# Altium footprint library Lay-51943_B.brd.PcbLib: 38 footprints (part 1 of 3)
Each footprint in its own frame and in the unit in brackets; x right, y up, seen from the top. Pads: shape width x height; smd on the part's side, far side on the other; paste and mask are expansions set on the pad; w line width, h text height; cw(c..) or ccw(c..) is an arc to the next point about the centre after c.
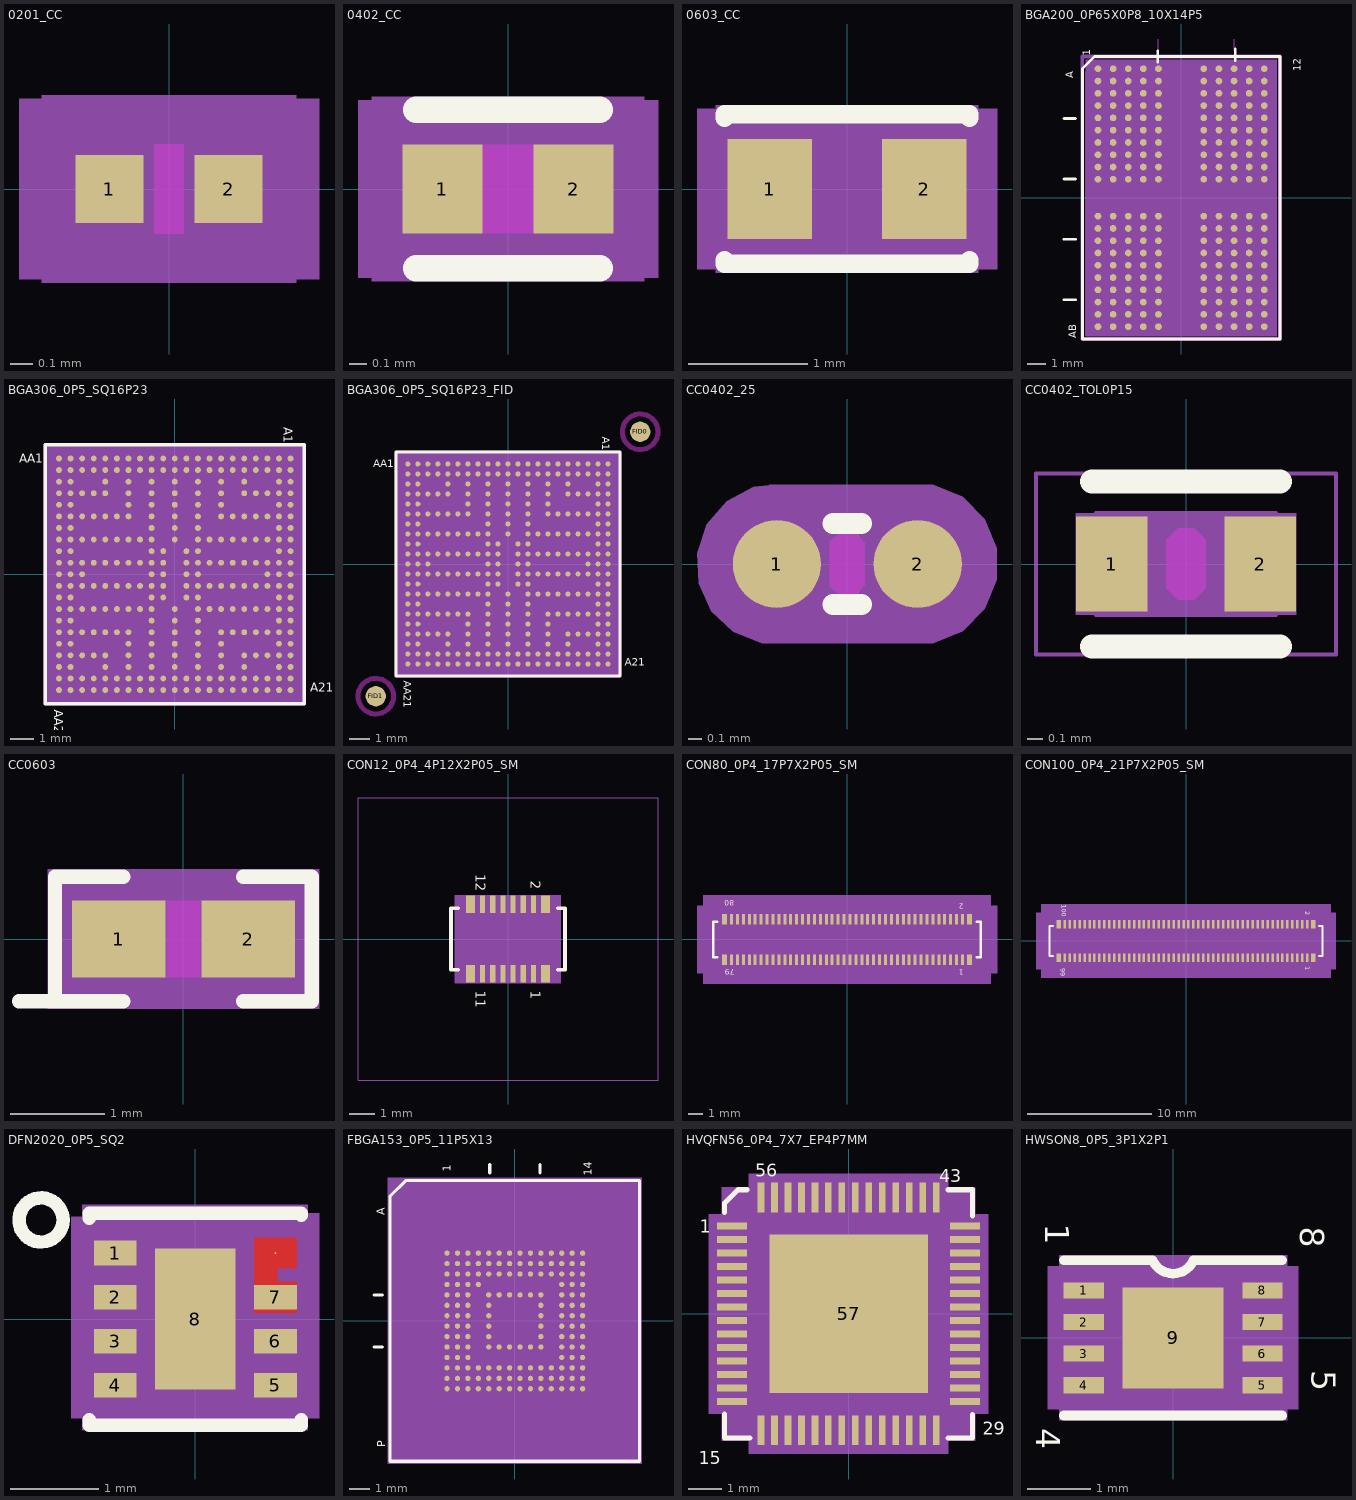
[diagram p0: the footprints below, top view; thin cyan lines are the x and y axes]

## 0201_CC [mil] "0201_CC"
pads (2):
  rect 12x12 smd: 1(-10.51,0) 2(10.51,0)
Top Layer keep-out:
  region: -2.64,7.87 -2.64,-7.87 2.64,-7.87 2.64,7.87
  region: -2.64,7.87 -2.64,-7.87 2.64,-7.87 2.64,7.87
Top Courtyard:
  region: -22.4,-16.5 -22.4,-15.91 -26.42,-15.91 -26.42,15.91 -22.4,15.91 -22.4,16.5 22.4,16.5 22.4,15.91 26.42,15.91 26.42,-15.91 22.4,-15.91 22.4,-16.5
Top Assembly:
  lines w1: -12.4,-6.5 -12.4,6.5 12.4,6.5 12.4,-6.5 -12.4,-6.5
Top Value:
  text ".Comment" at -51.17,-7.5 h15
Top Component Center:
  lines w1: -10,0 10,0 ; 0,-10 0,10
Top Designator:
  text ".Designator" at -54.7,-5.36 h15
Top Component Outline:
  region: -16.42,-5.91 -12.4,-5.91 -12.4,-6.5 12.4,-6.5 12.4,-5.91 16.42,-5.91 16.42,5.91 12.4,5.91 12.4,6.5 -12.4,6.5 -12.4,5.91 -16.42,5.91
3D body "CAPC0603X33N EIA 2220.step": height 12.99, standoff 0, extent -11.81,-5.91 11.81,5.91

## 0402_CC [mil] "0402_CC"
pads (2):
  rect 18x20 smd: 1(-14.76,0) 2(14.76,0)
Top Layer keep-out:
  region: -5.75,10 -5.75,-10 5.75,-10 5.75,10
  region: -5.75,10 -5.75,-10 5.75,-10 5.75,10
Top Overlay:
  lines w6: -20.67,-17.83 20.67,-17.83 ; -20.67,17.83 20.67,17.83
Top Courtyard:
  region: -30.67,-20.83 -30.67,-20 -33.78,-20 -33.78,20 -30.67,20 -30.67,20.83 30.67,20.83 30.67,20 33.78,20 33.78,-20 30.67,-20 30.67,-20.83
Top Assembly:
  lines w1: -20.67,-10.83 20.67,-10.83 20.67,10.83 -20.67,10.83 -20.67,-10.83
Top Value:
  text ".Comment" at -51.17,-7.5 h15
Top Component Center:
  lines w1: -10,0 10,0 ; 0,-10 0,10
Top Designator:
  text ".Designator" at -54.7,-5.36 h15
Top Component Outline:
  region: -23.78,-10 -20.67,-10 -20.67,-10.83 20.67,-10.83 20.67,-10 23.78,-10 23.78,10 20.67,10 20.67,10.83 -20.67,10.83 -20.67,10 -23.78,10
3D body "CAPC1005X60N EIA 0402.step": height 23.62, standoff 0, extent -19.68,-9.84 19.68,9.84

## 0603_CC [mil] "0603_CC"
pads (2):
  rect 28x33 smd: 1(-25.59,0) 2(25.59,0)
Top Overlay:
  lines w6: -40.47,-23.54 -40.47,-24.72 40.47,-24.72 40.47,-23.54 ; -40.47,23.54 -40.47,24.72 40.47,24.72 40.47,23.54
Top Courtyard:
  region: -43.46,-26.54 -49.61,-26.54 -49.61,26.54 -43.46,26.54 -43.46,27.72 43.46,27.72 43.46,26.54 49.61,26.54 49.61,-26.54 43.46,-26.54 43.46,-27.72 -43.46,-27.72
Top Assembly:
  lines w1: -33.46,-17.72 33.46,-17.72 33.46,17.72 -33.46,17.72 -33.46,-17.72
Top Value:
  text ".Comment" at -51.17,-7.5 h15
Top Component Center:
  lines w1: -10,0 10,0 ; 0,-10 0,10
Top Designator:
  text ".Designator" at -54.7,-5.36 h15
Top Component Outline:
  region: -39.61,-16.54 -33.46,-16.54 -33.46,-17.72 33.46,-17.72 33.46,-16.54 39.61,-16.54 39.61,16.54 33.46,16.54 33.46,17.72 -33.46,17.72 -33.46,16.54 -39.61,16.54
  region: -33.46,-17.72 33.46,-17.72 33.46,-16.54 39.61,-16.54 39.61,16.54 33.46,16.54 33.46,17.72 -33.46,17.72 -33.46,16.54 -39.61,16.54 -39.61,-16.54 -33.46,-16.54
3D body "CAPC1608X92N EIA 0603.step": height 36.22, standoff 0, extent -31.5,-15.75 31.5,15.75

## BGA200_0P65X0P8_10X14P5 [mil] "BGA200_0P65X0P8_10X14P5"
pads (200):
  round 14 smd: A1(-173.23,268.7) A2(-141.73,268.7) A3(-110.24,268.7) A4(-78.74,268.7) A5(-47.24,268.7) A8(47.24,268.7) A9(78.74,268.7) A10(110.24,268.7) A11(141.73,268.7) A12(173.23,268.7) AA1(-173.23,-243.11) AA2(-141.73,-243.11) AA3(-110.24,-243.11) AA4(-78.74,-243.11) AA5(-47.24,-243.11) AA8(47.24,-243.11) AA9(78.74,-243.11) AA10(110.24,-243.11) AA11(141.73,-243.11) AA12(173.23,-243.11) AB1(-173.23,-268.7) AB2(-141.73,-268.7) AB3(-110.24,-268.7) AB4(-78.74,-268.7) AB5(-47.24,-268.7) AB8(47.24,-268.7) AB9(78.74,-268.7) AB10(110.24,-268.7) AB11(141.73,-268.7) AB12(173.23,-268.7) B1(-173.23,243.11) B2(-141.73,243.11) B3(-110.24,243.11) B4(-78.74,243.11) B5(-47.24,243.11) B8(47.24,243.11) B9(78.74,243.11) B10(110.24,243.11) B11(141.73,243.11) B12(173.23,243.11) C1(-173.23,217.52) C2(-141.73,217.52) C3(-110.24,217.52) C4(-78.74,217.52) C5(-47.24,217.52) C8(47.24,217.52) C9(78.74,217.52) C10(110.24,217.52) C11(141.73,217.52) C12(173.23,217.52) D1(-173.23,191.93) D2(-141.73,191.93) D3(-110.24,191.93) D4(-78.74,191.93) D5(-47.24,191.93) D8(47.24,191.93) D9(78.74,191.93) D10(110.24,191.93) D11(141.73,191.93) D12(173.23,191.93) E1(-173.23,166.34) E2(-141.73,166.34) E3(-110.24,166.34) E4(-78.74,166.34) E5(-47.24,166.34) E8(47.24,166.34) E9(78.74,166.34) E10(110.24,166.34) E11(141.73,166.34) E12(173.23,166.34) F1(-173.23,140.75) F2(-141.73,140.75) F3(-110.24,140.75) F4(-78.74,140.75) F5(-47.24,140.75) F8(47.24,140.75) F9(78.74,140.75) F10(110.24,140.75) F11(141.73,140.75) F12(173.23,140.75) G1(-173.23,115.16) G2(-141.73,115.16) G3(-110.24,115.16) G4(-78.74,115.16) G5(-47.24,115.16) G8(47.24,115.16) G9(78.74,115.16) G10(110.24,115.16) G11(141.73,115.16) G12(173.23,115.16) H1(-173.23,89.57) H2(-141.73,89.57) H3(-110.24,89.57) H4(-78.74,89.57) H5(-47.24,89.57) H8(47.24,89.57) H9(78.74,89.57) H10(110.24,89.57) H11(141.73,89.57) H12(173.23,89.57) J1(-173.23,63.98) J2(-141.73,63.98) J3(-110.24,63.98) J4(-78.74,63.98) J5(-47.24,63.98) J8(47.24,63.98) J9(78.74,63.98) J10(110.24,63.98) J11(141.73,63.98) J12(173.23,63.98) K1(-173.23,38.39) K2(-141.73,38.39) K3(-110.24,38.39) K4(-78.74,38.39) K5(-47.24,38.39) K8(47.24,38.39) K9(78.74,38.39) K10(110.24,38.39) K11(141.73,38.39) K12(173.23,38.39) N1(-173.23,-38.39) N2(-141.73,-38.39) N3(-110.24,-38.39) N4(-78.74,-38.39) N5(-47.24,-38.39) N8(47.24,-38.39) N9(78.74,-38.39) N10(110.24,-38.39) N11(141.73,-38.39) N12(173.23,-38.39) P1(-173.23,-63.98) P2(-141.73,-63.98) P3(-110.24,-63.98) P4(-78.74,-63.98) P5(-47.24,-63.98) P8(47.24,-63.98) P9(78.74,-63.98) P10(110.24,-63.98) P11(141.73,-63.98) P12(173.23,-63.98) R1(-173.23,-89.57) R2(-141.73,-89.57) R3(-110.24,-89.57) R4(-78.74,-89.57) R5(-47.24,-89.57) R8(47.24,-89.57) R9(78.74,-89.57) R10(110.24,-89.57) R11(141.73,-89.57) R12(173.23,-89.57) T1(-173.23,-115.16) T2(-141.73,-115.16) T3(-110.24,-115.16) T4(-78.74,-115.16) T5(-47.24,-115.16) T8(47.24,-115.16) T9(78.74,-115.16) T10(110.24,-115.16) T11(141.73,-115.16) T12(173.23,-115.16) U1(-173.23,-140.75) U2(-141.73,-140.75) U3(-110.24,-140.75) U4(-78.74,-140.75) U5(-47.24,-140.75) U8(47.24,-140.75) U9(78.74,-140.75) U10(110.24,-140.75) U11(141.73,-140.75) U12(173.23,-140.75) V1(-173.23,-166.34) V2(-141.73,-166.34) V3(-110.24,-166.34) V4(-78.74,-166.34) V5(-47.24,-166.34) V8(47.24,-166.34) V9(78.74,-166.34) V10(110.24,-166.34) V11(141.73,-166.34) V12(173.23,-166.34) W1(-173.23,-191.93) W2(-141.73,-191.93) W3(-110.24,-191.93) W4(-78.74,-191.93) W5(-47.24,-191.93) W8(47.24,-191.93) W9(78.74,-191.93) W10(110.24,-191.93) W11(141.73,-191.93) W12(173.23,-191.93) Y1(-173.23,-217.52) Y2(-141.73,-217.52) Y3(-110.24,-217.52) Y4(-78.74,-217.52) Y5(-47.24,-217.52) Y8(47.24,-217.52) Y9(78.74,-217.52) Y10(110.24,-217.52) Y11(141.73,-217.52) Y12(173.23,-217.52)
Top Overlay:
  lines w6: -244.09,-212.6 -220.47,-212.6 ; -244.09,-86.61 -220.47,-86.61 ; -244.09,39.37 -220.47,39.37 ; -244.09,165.35 -220.47,165.35 ; -48.69,282.48 -48.69,306.1 ; 112.65,285.86 112.65,309.48 ; -205.82,-294.4 205.82,-294.4 205.82,294.4 -180.82,294.4 -205.82,269.4 -205.82,-294.4
  text "AB" at -218.98,-292.93 h15
  text "A" at -224.32,248.74 h15
  text "1" at -189.51,295.77 h15
  text "12" at 249.39,263.64 h15
Top Courtyard:
  lines w7.87: -205.82,-294.4 -205.82,294.4 205.82,294.4 205.82,-294.4 -205.82,-294.4
Top Assembly:
  circle w2: c-173.23,259.84 r15.75
  lines w1: -244.09,-212.6 -220.47,-212.6 ; -244.09,-86.61 -220.47,-86.61 ; -244.09,39.37 -220.47,39.37 ; -244.09,165.35 -220.47,165.35 ; -47.24,307.09 -47.24,330.71 ; 110.24,307.09 110.24,330.71 ; -198.82,-287.4 198.82,-287.4 198.82,287.4 -173.82,287.4 -198.82,262.4 -198.82,-287.4
  text "AB" at -259.84,-283.46 h25
  text "A" at -236.22,259.84 h10
  text "12" at 173.23,307.09 h25
  text "1" at -173.23,307.09 h10
Top Value:
  text ".Comment" at 7.5,-51.17 h15
Top Component Center:
  lines w1: -10,0 10,0 ; 0,-10 0,10
Top Designator:
  text ".Designator" at 5.36,-54.7 h15
Top Component Outline:
  region: -198.82,-287.4 198.82,-287.4 198.82,287.4 -198.82,287.4
  region: -198.82,-287.4 198.82,-287.4 198.82,287.4 -198.82,287.4
3D body "FPGA200_LPDDR4.stp": height 39.37, standoff -2.52, extent -196.85,-295.28 196.85,295.28

## BGA306_0P5_SQ16P23 [mil] "SKT_BGA306_0P5_SQ16P23_ELAST but without the socket or elastomer crap. Without Fiducials"
pads (306):
  round 10 smd: A1(196.69,196.85) A2(196.69,177.17) A3(196.69,157.48) A4(196.69,137.8) A5(196.69,118.11) A6(196.69,98.43) A7(196.69,78.74) A8(196.69,59.06) A9(196.69,39.37) A10(196.69,19.69) A11(196.69,0) A12(196.69,-19.69) A13(196.69,-39.37) A14(196.69,-59.06) A15(196.69,-78.74) A16(196.69,-98.43) A17(196.69,-118.11) A18(196.69,-137.8) A19(196.69,-157.48) A20(196.69,-177.17) A21(196.69,-196.85) AA1(-197.01,196.85) AA2(-197.01,177.17) AA3(-197.01,157.48) AA4(-197.01,137.8) AA5(-197.01,118.11) AA6(-197.01,98.43) AA7(-197.01,78.74) AA8(-197.01,59.06) AA9(-197.01,39.37) AA10(-197.01,19.69) AA11(-197.01,0) AA12(-197.01,-19.69) AA13(-197.01,-39.37) AA14(-197.01,-59.06) AA15(-197.01,-78.74) AA16(-197.01,-98.43) AA17(-197.01,-118.11) AA18(-197.01,-137.8) AA19(-197.01,-157.48) AA20(-197.01,-177.17) AA21(-197.01,-196.85) B1(177.01,196.85) B2(177.01,177.17) B3(177.01,157.48) B4(177.01,137.8) B5(177.01,118.11) B6(177.01,98.43) B7(177.01,78.74) B8(177.01,59.06) B9(177.01,39.37) B10(177.01,19.69) B11(177.01,0) B12(177.01,-19.69) B13(177.01,-39.37) B14(177.01,-59.06) B15(177.01,-78.74) B16(177.01,-98.43) B17(177.01,-118.11) B18(177.01,-137.8) B19(177.01,-157.48) B20(177.01,-177.17) B21(177.01,-196.85) C1(157.32,196.85) C2(157.32,177.17) C4(157.32,137.8) C6(157.32,98.43) C8(157.32,59.06) C10(157.32,19.69) C11(157.32,0) C12(157.32,-19.69) C14(157.32,-59.06) C16(157.32,-98.43) C18(157.32,-137.8) C20(157.32,-177.17) C21(157.32,-196.85) D1(137.64,196.85) D2(137.64,177.17) D4(137.64,137.8) D6(137.64,98.43) D8(137.64,59.06) D10(137.64,19.69) D12(137.64,-19.69) D14(137.64,-59.06) D16(137.64,-98.43) D18(137.64,-137.8) D20(137.64,-177.17) D21(137.64,-196.85) E1(117.95,196.85) E2(117.95,177.17) E3(117.95,157.48) E4(117.95,137.8) E6(117.95,98.43) E8(117.95,59.06) E10(117.95,19.69) E12(117.95,-19.69) E14(117.95,-59.06) E16(117.95,-98.43) E18(117.95,-137.8) E19(117.95,-157.48) E20(117.95,-177.17) E21(117.95,-196.85) F1(98.27,196.85) F2(98.27,177.17) F6(98.27,98.43) F8(98.27,59.06) F10(98.27,19.69) F12(98.27,-19.69) F14(98.27,-59.06) F16(98.27,-98.43) F20(98.27,-177.17) F21(98.27,-196.85) G1(78.58,196.85) G2(78.58,177.17) G3(78.58,157.48) G4(78.58,137.8) G5(78.58,118.11) G6(78.58,98.43) G8(78.58,59.06) G10(78.58,19.69) G12(78.58,-19.69) G14(78.58,-59.06) G16(78.58,-98.43) G17(78.58,-118.11) G18(78.58,-137.8) G19(78.58,-157.48) G20(78.58,-177.17) G21(78.58,-196.85) H1(58.9,196.85) H2(58.9,177.17) H8(58.9,59.06) H10(58.9,19.69) H12(58.9,-19.69) H14(58.9,-59.06) H20(58.9,-177.17) H21(58.9,-196.85) J1(39.21,196.85) J2(39.21,177.17) J3(39.21,157.48) J4(39.21,137.8) J5(39.21,118.11) J6(39.21,98.43) J7(39.21,78.74) J8(39.21,59.06) J9(39.21,39.37) J10(39.21,19.69) J11(39.21,0) J12(39.21,-19.69) J13(39.21,-39.37) J14(39.21,-59.06) J15(39.21,-78.74) J16(39.21,-98.43) J17(39.21,-118.11) J18(39.21,-137.8) J19(39.21,-157.48) J20(39.21,-177.17) J21(39.21,-196.85) K1(19.53,196.85) K2(19.53,177.17) K9(19.53,39.37) K10(19.53,19.69) K11(19.53,0) K12(19.53,-19.69) K13(19.53,-39.37) K20(19.53,-177.17) K21(19.53,-196.85) L1(-0.16,196.85) L2(-0.16,177.17) L3(-0.16,157.48) L4(-0.16,137.8) L5(-0.16,118.11) L6(-0.16,98.43) L7(-0.16,78.74) L8(-0.16,59.06) L14(-0.16,-59.06) L15(-0.16,-78.74) L16(-0.16,-98.43) L17(-0.16,-118.11) L18(-0.16,-137.8) L19(-0.16,-157.48) L20(-0.16,-177.17) L21(-0.16,-196.85) M1(-19.84,196.85) M2(-19.84,177.17) M9(-19.84,39.37) M10(-19.84,19.69) M11(-19.84,0) M12(-19.84,-19.69) M13(-19.84,-39.37) M20(-19.84,-177.17) M21(-19.84,-196.85) N1(-39.53,196.85) N2(-39.53,177.17) N3(-39.53,157.48) N4(-39.53,137.8) N5(-39.53,118.11) N6(-39.53,98.43) N7(-39.53,78.74) N8(-39.53,59.06) N9(-39.53,39.37) N10(-39.53,19.69) N11(-39.53,0) N12(-39.53,-19.69) N13(-39.53,-39.37) N14(-39.53,-59.06) N15(-39.53,-78.74) N16(-39.53,-98.43) N17(-39.53,-118.11) N18(-39.53,-137.8) N19(-39.53,-157.48) N20(-39.53,-177.17) N21(-39.53,-196.85) P1(-59.21,196.85) P2(-59.21,177.17) P8(-59.21,59.06) P10(-59.21,19.69) P12(-59.21,-19.69) P14(-59.21,-59.06) P20(-59.21,-177.17) P21(-59.21,-196.85) R1(-78.9,196.85) R2(-78.9,177.17) R3(-78.9,157.48) R4(-78.9,137.8) R5(-78.9,118.11) R6(-78.9,98.43) R8(-78.9,59.06) R10(-78.9,19.69) R12(-78.9,-19.69) R14(-78.9,-59.06) R16(-78.9,-98.43) R17(-78.9,-118.11) R18(-78.9,-137.8) R19(-78.9,-157.48) R20(-78.9,-177.17) R21(-78.9,-196.85) T1(-98.58,196.85) T2(-98.58,177.17) T6(-98.58,98.43) T8(-98.58,59.06) T10(-98.58,19.69) T12(-98.58,-19.69) T14(-98.58,-59.06) T16(-98.58,-98.43) T20(-98.58,-177.17) T21(-98.58,-196.85) U1(-118.27,196.85) U2(-118.27,177.17) U3(-118.27,157.48) U4(-118.27,137.8) U6(-118.27,98.43) U8(-118.27,59.06) U10(-118.27,19.69) U12(-118.27,-19.69) U14(-118.27,-59.06) U16(-118.27,-98.43) U18(-118.27,-137.8) U19(-118.27,-157.48) U20(-118.27,-177.17) U21(-118.27,-196.85) V1(-137.95,196.85) V2(-137.95,177.17) V4(-137.95,137.8) V6(-137.95,98.43) V8(-137.95,59.06) V10(-137.95,19.69) V12(-137.95,-19.69) V14(-137.95,-59.06) V16(-137.95,-98.43) V18(-137.95,-137.8) V20(-137.95,-177.17) V21(-137.95,-196.85) W1(-157.64,196.85) W2(-157.64,177.17) W4(-157.64,137.8) W6(-157.64,98.43) W8(-157.64,59.06) W10(-157.64,19.69) W11(-157.64,0) W12(-157.64,-19.69) W14(-157.64,-59.06) W16(-157.64,-98.43) W18(-157.64,-137.8) W20(-157.64,-177.17) W21(-157.64,-196.85) Y1(-177.32,196.85) Y2(-177.32,177.17) Y3(-177.32,157.48) Y4(-177.32,137.8) Y5(-177.32,118.11) Y6(-177.32,98.43) Y7(-177.32,78.74) Y8(-177.32,59.06) Y9(-177.32,39.37) Y10(-177.32,19.69) Y11(-177.32,0) Y12(-177.32,-19.69) Y13(-177.32,-39.37) Y14(-177.32,-59.06) Y15(-177.32,-78.74) Y16(-177.32,-98.43) Y17(-177.32,-118.11) Y18(-177.32,-137.8) Y19(-177.32,-157.48) Y20(-177.32,-177.17) Y21(-177.32,-196.85)
Top Overlay:
  lines w6: -220,-220 -220,220 220,220 220,-220 -220,-220
  text "A21" at 230,-200 h15
  text "AA1" at -265,190 h15
  text "A1" at 185,250 h15
  text "AA21" at -205,-230 h15
Top Courtyard:
  lines w6: -220,-220 -220,220 220,220 220,-220 -220,-220
Top Assembly:
  lines w6: -220,-220 -220,220 220,220 220,-220 -220,-220
Top Value:
  text ".Comment" at -61.17,-7.5 h15
Top Component Center:
  lines w1: -20,0 0,0 -20,0 ; -10,-10 -10,10 -10,-10
Top Designator:
  text ".Designator" at -64.7,-5.36 h15
Top Component Outline:
  region: -220,-220 220,-220 220,220 -220,220
  region: -220,220 220,220 220,-220 -220,-220
3D body "NXP_FC-BGA-306.stp": height 48.03, standoff 0, extent -216.54,-216.54 216.54,216.54

## BGA306_0P5_SQ16P23_FID [mil] "SKT_BGA306_0P5_SQ16P23_ELAST but without the socket or elastomer crap. With Fiducials"
pads (308):
  round 10 smd: A1(196.69,196.85) A2(196.69,177.17) A3(196.69,157.48) A4(196.69,137.8) A5(196.69,118.11) A6(196.69,98.43) A7(196.69,78.74) A8(196.69,59.06) A9(196.69,39.37) A10(196.69,19.69) A11(196.69,0) A12(196.69,-19.69) A13(196.69,-39.37) A14(196.69,-59.06) A15(196.69,-78.74) A16(196.69,-98.43) A17(196.69,-118.11) A18(196.69,-137.8) A19(196.69,-157.48) A20(196.69,-177.17) A21(196.69,-196.85) AA1(-197.01,196.85) AA2(-197.01,177.17) AA3(-197.01,157.48) AA4(-197.01,137.8) AA5(-197.01,118.11) AA6(-197.01,98.43) AA7(-197.01,78.74) AA8(-197.01,59.06) AA9(-197.01,39.37) AA10(-197.01,19.69) AA11(-197.01,0) AA12(-197.01,-19.69) AA13(-197.01,-39.37) AA14(-197.01,-59.06) AA15(-197.01,-78.74) AA16(-197.01,-98.43) AA17(-197.01,-118.11) AA18(-197.01,-137.8) AA19(-197.01,-157.48) AA20(-197.01,-177.17) AA21(-197.01,-196.85) B1(177.01,196.85) B2(177.01,177.17) B3(177.01,157.48) B4(177.01,137.8) B5(177.01,118.11) B6(177.01,98.43) B7(177.01,78.74) B8(177.01,59.06) B9(177.01,39.37) B10(177.01,19.69) B11(177.01,0) B12(177.01,-19.69) B13(177.01,-39.37) B14(177.01,-59.06) B15(177.01,-78.74) B16(177.01,-98.43) B17(177.01,-118.11) B18(177.01,-137.8) B19(177.01,-157.48) B20(177.01,-177.17) B21(177.01,-196.85) C1(157.32,196.85) C2(157.32,177.17) C4(157.32,137.8) C6(157.32,98.43) C8(157.32,59.06) C10(157.32,19.69) C11(157.32,0) C12(157.32,-19.69) C14(157.32,-59.06) C16(157.32,-98.43) C18(157.32,-137.8) C20(157.32,-177.17) C21(157.32,-196.85) D1(137.64,196.85) D2(137.64,177.17) D4(137.64,137.8) D6(137.64,98.43) D8(137.64,59.06) D10(137.64,19.69) D12(137.64,-19.69) D14(137.64,-59.06) D16(137.64,-98.43) D18(137.64,-137.8) D20(137.64,-177.17) D21(137.64,-196.85) E1(117.95,196.85) E2(117.95,177.17) E3(117.95,157.48) E4(117.95,137.8) E6(117.95,98.43) E8(117.95,59.06) E10(117.95,19.69) E12(117.95,-19.69) E14(117.95,-59.06) E16(117.95,-98.43) E18(117.95,-137.8) E19(117.95,-157.48) E20(117.95,-177.17) E21(117.95,-196.85) F1(98.27,196.85) F2(98.27,177.17) F6(98.27,98.43) F8(98.27,59.06) F10(98.27,19.69) F12(98.27,-19.69) F14(98.27,-59.06) F16(98.27,-98.43) F20(98.27,-177.17) F21(98.27,-196.85) G1(78.58,196.85) G2(78.58,177.17) G3(78.58,157.48) G4(78.58,137.8) G5(78.58,118.11) G6(78.58,98.43) G8(78.58,59.06) G10(78.58,19.69) G12(78.58,-19.69) G14(78.58,-59.06) G16(78.58,-98.43) G17(78.58,-118.11) G18(78.58,-137.8) G19(78.58,-157.48) G20(78.58,-177.17) G21(78.58,-196.85) H1(58.9,196.85) H2(58.9,177.17) H8(58.9,59.06) H10(58.9,19.69) H12(58.9,-19.69) H14(58.9,-59.06) H20(58.9,-177.17) H21(58.9,-196.85) J1(39.21,196.85) J2(39.21,177.17) J3(39.21,157.48) J4(39.21,137.8) J5(39.21,118.11) J6(39.21,98.43) J7(39.21,78.74) J8(39.21,59.06) J9(39.21,39.37) J10(39.21,19.69) J11(39.21,0) J12(39.21,-19.69) J13(39.21,-39.37) J14(39.21,-59.06) J15(39.21,-78.74) J16(39.21,-98.43) J17(39.21,-118.11) J18(39.21,-137.8) J19(39.21,-157.48) J20(39.21,-177.17) J21(39.21,-196.85) K1(19.53,196.85) K2(19.53,177.17) K9(19.53,39.37) K10(19.53,19.69) K11(19.53,0) K12(19.53,-19.69) K13(19.53,-39.37) K20(19.53,-177.17) K21(19.53,-196.85) L1(-0.16,196.85) L2(-0.16,177.17) L3(-0.16,157.48) L4(-0.16,137.8) L5(-0.16,118.11) L6(-0.16,98.43) L7(-0.16,78.74) L8(-0.16,59.06) L14(-0.16,-59.06) L15(-0.16,-78.74) L16(-0.16,-98.43) L17(-0.16,-118.11) L18(-0.16,-137.8) L19(-0.16,-157.48) L20(-0.16,-177.17) L21(-0.16,-196.85) M1(-19.84,196.85) M2(-19.84,177.17) M9(-19.84,39.37) M10(-19.84,19.69) M11(-19.84,0) M12(-19.84,-19.69) M13(-19.84,-39.37) M20(-19.84,-177.17) M21(-19.84,-196.85) N1(-39.53,196.85) N2(-39.53,177.17) N3(-39.53,157.48) N4(-39.53,137.8) N5(-39.53,118.11) N6(-39.53,98.43) N7(-39.53,78.74) N8(-39.53,59.06) N9(-39.53,39.37) N10(-39.53,19.69) N11(-39.53,0) N12(-39.53,-19.69) N13(-39.53,-39.37) N14(-39.53,-59.06) N15(-39.53,-78.74) N16(-39.53,-98.43) N17(-39.53,-118.11) N18(-39.53,-137.8) N19(-39.53,-157.48) N20(-39.53,-177.17) N21(-39.53,-196.85) P1(-59.21,196.85) P2(-59.21,177.17) P8(-59.21,59.06) P10(-59.21,19.69) P12(-59.21,-19.69) P14(-59.21,-59.06) P20(-59.21,-177.17) P21(-59.21,-196.85) R1(-78.9,196.85) R2(-78.9,177.17) R3(-78.9,157.48) R4(-78.9,137.8) R5(-78.9,118.11) R6(-78.9,98.43) R8(-78.9,59.06) R10(-78.9,19.69) R12(-78.9,-19.69) R14(-78.9,-59.06) R16(-78.9,-98.43) R17(-78.9,-118.11) R18(-78.9,-137.8) R19(-78.9,-157.48) R20(-78.9,-177.17) R21(-78.9,-196.85) T1(-98.58,196.85) T2(-98.58,177.17) T6(-98.58,98.43) T8(-98.58,59.06) T10(-98.58,19.69) T12(-98.58,-19.69) T14(-98.58,-59.06) T16(-98.58,-98.43) T20(-98.58,-177.17) T21(-98.58,-196.85) U1(-118.27,196.85) U2(-118.27,177.17) U3(-118.27,157.48) U4(-118.27,137.8) U6(-118.27,98.43) U8(-118.27,59.06) U10(-118.27,19.69) U12(-118.27,-19.69) U14(-118.27,-59.06) U16(-118.27,-98.43) U18(-118.27,-137.8) U19(-118.27,-157.48) U20(-118.27,-177.17) U21(-118.27,-196.85) V1(-137.95,196.85) V2(-137.95,177.17) V4(-137.95,137.8) V6(-137.95,98.43) V8(-137.95,59.06) V10(-137.95,19.69) V12(-137.95,-19.69) V14(-137.95,-59.06) V16(-137.95,-98.43) V18(-137.95,-137.8) V20(-137.95,-177.17) V21(-137.95,-196.85) W1(-157.64,196.85) W2(-157.64,177.17) W4(-157.64,137.8) W6(-157.64,98.43) W8(-157.64,59.06) W10(-157.64,19.69) W11(-157.64,0) W12(-157.64,-19.69) W14(-157.64,-59.06) W16(-157.64,-98.43) W18(-157.64,-137.8) W20(-157.64,-177.17) W21(-157.64,-196.85) Y1(-177.32,196.85) Y2(-177.32,177.17) Y3(-177.32,157.48) Y4(-177.32,137.8) Y5(-177.32,118.11) Y6(-177.32,98.43) Y7(-177.32,78.74) Y8(-177.32,59.06) Y9(-177.32,39.37) Y10(-177.32,19.69) Y11(-177.32,0) Y12(-177.32,-19.69) Y13(-177.32,-39.37) Y14(-177.32,-59.06) Y15(-177.32,-78.74) Y16(-177.32,-98.43) Y17(-177.32,-118.11) Y18(-177.32,-137.8) Y19(-177.32,-157.48) Y20(-177.32,-177.17) Y21(-177.32,-196.85)
  round 40 smd paste-99999 mask+20: FID0(260,260) FID1(-260,-260)
Top Layer keep-out:
  circle w10: c-260,-260 r35
  circle w10: c260,260 r35
Top Overlay:
  lines w6: -220,-220 -220,220 220,220 220,-220 -220,-220
  text "A21" at 230,-200 h15
  text "AA1" at -265,190 h15
  text "A1" at 185,250 h15
  text "AA21" at -205,-230 h15
Top Courtyard:
  lines w6: -220,-220 -220,220 220,220 220,-220 -220,-220
Top Assembly:
  lines w6: -220,-220 -220,220 220,220 220,-220 -220,-220
Top Value:
  text ".Comment" at -61.17,-7.5 h15
Top Component Center:
  lines w1: -20,0 0,0 -20,0 ; -10,-10 -10,10 -10,-10
Top Designator:
  text ".Designator" at -64.7,-5.36 h15
Top Component Outline:
  region: -220,-220 220,-220 220,220 -220,220
  region: -220,220 220,220 220,-220 -220,-220
3D body "NXP_FC-BGA-306.stp": height 48.03, standoff 0, extent -216.54,-216.54 216.54,216.54

## CC0402_25 [mil] "CC0402_25"
pads (2):
  round 25 smd: 1(-20,0) 2(20,0)
Top Layer keep-out:
  region: 5,4 5,-4 5,-6.07 2.07,-9 -2.07,-9 -5,-6.07 -5,-4 -5,4 -5,6.07 -2.07,9 2.07,9 5,6.07
Top Overlay:
  lines w6: -4,-11.5 4,-11.5 ; -4,11.5 4,11.5
Top Courtyard:
  region: -22.1,22.5 20,22.5 24.48,22.5 32.75,19.07 39.07,12.75 42.5,4.48 42.5,-4.48 39.07,-12.75 32.75,-19.07 24.48,-22.5 20,-22.5 -20,-22.5 -24.32,-22.5 -32.34,-19.3 -38.6,-13.35 -42.21,-5.5 -42.65,3.12 -39.86,11.29 -34.25,17.85 -26.6,21.86 -22.3,22.3
Top Assembly:
  lines w1: -20,-10 -20,10 20,10 20,-10 -20,-10
Top Value:
  text ".Comment" at -51.17,-7.5 h15
Top Component Center:
  lines w1: -10,0 10,0 ; 0,-10 0,10
Top Designator:
  text ".Designator" at -54.7,-5.36 h15
Top Component Outline:
  region: 19.5,-12.5 20,-12.5 22.49,-12.5 27.08,-10.6 30.6,-7.08 32.5,-2.49 32.5,2.49 30.6,7.08 27.08,10.6 22.49,12.5 20,12.5 -20,12.5 -22.49,12.5 -27.08,10.6 -30.6,7.08 -32.5,2.49 -32.5,-2.49 -30.6,-7.08 -27.08,-10.6 -22.49,-12.5 -20,-12.5
  region: 19.5,-12.5 20,-12.5 22.49,-12.5 27.08,-10.6 30.6,-7.08 32.5,-2.49 32.5,2.49 30.6,7.08 27.08,10.6 22.49,12.5 20,12.5 -19.5,12.5 -20,12.5 -22.49,12.5 -27.08,10.6 -30.6,7.08 -32.5,2.49 -32.5,-2.49 -30.6,-7.08 -27.08,-10.6 -22.49,-12.5 -20,-12.5
3D body "CAPC1005X55N EIA 0402.step": height 21.65, standoff 0, extent -19.68,-9.84 19.68,9.84

## CC0402_TOL0P15 [mil] "CC0402_TOL0P15"
pads (2):
  rect 18x24 smd: 1(-18.7,0) 2(18.7,0)
Top Layer keep-out:
  region: 5,4 5,-4 5,-6.07 2.07,-9 -2.07,-9 -5,-6.07 -5,-4 -5,4 -5,6.07 -2.07,9 2.07,9 5,6.07
Top Overlay:
  lines w6: -23.62,-20.78 23.62,-20.78 ; -23.62,20.78 23.62,20.78
Top Courtyard:
  lines w1: -37.7,-22.8 -37.7,22.8 37.7,22.8 37.7,-22.8 -37.7,-22.8
Top Assembly:
  lines w1: -22.64,-12.8 -22.64,12.8 22.64,12.8 22.64,-12.8 -22.64,-12.8
Top Value:
  text ".Comment" at -51.17,-7.5 h15
Top Component Center:
  lines w1: -10,0 10,0 ; 0,-10 0,10
Top Designator:
  text ".Designator" at -54.7,-5.36 h15
Top Component Outline:
  region: -27.7,-12.8 -27.7,12.8 27.7,12.8 27.7,-12.8
  region: 27.7,12.8 27.7,-12.8 -27.7,-12.8 -27.7,12.8
3D body "CAPC1005X56N EIA 0402.step": height 22.05, standoff 0, extent -19.68,-9.84 19.68,9.84

## CC0603 [mil] "CC0603"
pads (2):
  rect 39x32 smd: 1(-27,0) 2(27,0)
Top Layer keep-out:
  region: -7,-16 -7,16 7,16 7,-16
Top Overlay:
  lines w6: -68.5,-26 -53.5,-26 ; -25,-26 -53.5,-26 ; -25,26 -53.5,26 -53.5,-26 ; 25,-26 53.5,-26 53.5,26 25,26
Top Courtyard:
  region: -56.5,-29 56.5,-29 56.5,29 -56.5,29
Top Assembly:
  lines w1: -49.5,-19 34.5,-19 34.5,19 -34.5,19 -34.5,-19
Top Value:
  text ".Comment" at -51.17,-7.5 h15
Top Component Center:
  lines w1: -10,0 10,0 ; 0,-10 0,10
Top Designator:
  text ".Designator" at -54.7,-5.36 h15
Top Component Outline:
  region: -46.5,-22 -46.5,22 46.5,22 46.5,-22
  region: -46.5,-22 46.5,-22 46.5,22 -46.5,22
3D body "CAPC1608X92N EIA 0603.step": height 36.22, standoff 0, extent -31.5,-15.75 31.5,15.75

## CON12_0P4_4P12X2P05_SM [mil] "CON12_0P4_4P12X2P05_SM"
pads (16):
  rect 8x27 smd: 1(39.37,-53.85) 2(39.37,53.85) 3(23.62,-53.85) 4(23.62,53.85) 5(7.87,-53.85) 6(7.87,53.85) 7(-7.87,-53.85) 8(-7.87,53.85) 9(-23.62,-53.85) 10(-23.62,53.85) 11(-39.37,-53.85) 12(-39.37,53.85)
  rect 14x27 smd: ""(-58.07,-53.85) ""(-58.07,53.85) ""(58.07,-53.85) ""(58.07,53.85)
Top Overlay:
  lines w6: -76.77,-47.35 -88.1,-47.35 -88.1,47.35 -76.77,47.35 ; 76.77,-47.35 88.1,-47.35 88.1,47.35 76.77,47.35
  text "12" at -50,100 h15
  text "11" at -50,-80 h15
  text "2" at 35,90 h15
  text "1" at 35,-80 h15
Top Assembly:
  lines w1: -81.1,-40.35 81.1,-40.35 81.1,40.35 -81.1,40.35 -81.1,-40.35
Top Value:
  lines w1: -81.1,-67.35 81.1,-67.35 81.1,67.35 -81.1,67.35 -81.1,-67.35
  text ".Comment" at -51.17,-7.5 h15
Top Component Center:
  lines w1: -10,0 10,0 ; 0,-10 0,10
Top Designator:
  text ".Designator" at -54.7,-5.36 h15
Top Component Outline:
  region: -81.1,-67.35 81.1,-67.35 81.1,67.35 -81.1,67.35
Bottom Component Outline:
  lines w1: -231.1,-217.35 231.1,-217.35 231.1,217.35 -231.1,217.35 -231.1,-217.35
3D body "DF40C-12DP.stp": height 45.38, standoff 0.5, extent -77.26,-58.22 77.07,58.71

## CON80_0P4_17P7X2P05_SM [mil] "CON80_0P4_17P7X2P05_SM"
pads (84):
  rect 8x27 smd: 1(307.09,-53.85) 2(307.09,53.85) 3(291.34,-53.85) 4(291.34,53.85) 5(275.59,-53.85) 6(275.59,53.85) 7(259.84,-53.85) 8(259.84,53.85) 9(244.09,-53.85) 10(244.09,53.85) 11(228.35,-53.85) 12(228.35,53.85) 13(212.6,-53.85) 14(212.6,53.85) 15(196.85,-53.85) 16(196.85,53.85) 17(181.1,-53.85) 18(181.1,53.85) 19(165.35,-53.85) 20(165.35,53.85) 21(149.61,-53.85) 22(149.61,53.85) 23(133.86,-53.85) 24(133.86,53.85) 25(118.11,-53.85) 26(118.11,53.85) 27(102.36,-53.85) 28(102.36,53.85) 29(86.61,-53.85) 30(86.61,53.85) 31(70.87,-53.85) 32(70.87,53.85) 33(55.12,-53.85) 34(55.12,53.85) 35(39.37,-53.85) 36(39.37,53.85) 37(23.62,-53.85) 38(23.62,53.85) 39(7.87,-53.85) 40(7.87,53.85) 41(-7.87,-53.85) 42(-7.87,53.85) 43(-23.62,-53.85) 44(-23.62,53.85) 45(-39.37,-53.85) 46(-39.37,53.85) 47(-55.12,-53.85) 48(-55.12,53.85) 49(-70.87,-53.85) 50(-70.87,53.85) 51(-86.61,-53.85) 52(-86.61,53.85) 53(-102.36,-53.85) 54(-102.36,53.85) 55(-118.11,-53.85) 56(-118.11,53.85) 57(-133.86,-53.85) 58(-133.86,53.85) 59(-149.61,-53.85) 60(-149.61,53.85) 61(-165.35,-53.85) 62(-165.35,53.85) 63(-181.1,-53.85) 64(-181.1,53.85) 65(-196.85,-53.85) 66(-196.85,53.85) 67(-212.6,-53.85) 68(-212.6,53.85) 69(-228.35,-53.85) 70(-228.35,53.85) 71(-244.09,-53.85) 72(-244.09,53.85) 73(-259.84,-53.85) 74(-259.84,53.85) 75(-275.59,-53.85) 76(-275.59,53.85) 77(-291.34,-53.85) 78(-291.34,53.85) 79(-307.09,-53.85) 80(-307.09,53.85)
  rect 14x27 smd: ""(-325.79,-53.85) ""(-325.79,53.85) ""(325.79,-53.85) ""(325.79,53.85)
Top Overlay:
  lines w6: -344.49,-47.35 -355.82,-47.35 -355.82,47.35 -344.49,47.35 ; 344.49,-47.35 355.82,-47.35 355.82,47.35 344.49,47.35
  text "1" at 310,-80 h15
  text "2" at 310,95 h15
  text "79" at -298.97,-79.21 h15
  text "80" at -300,105 h15
Top Courtyard:
  region: 382.79,-117.35 -382.79,-117.35 -382.79,-90.35 -398.82,-90.35 -398.82,90.35 -382.79,90.35 -382.79,117.35 382.79,117.35 382.79,90.35 398.82,90.35 398.82,-90.35 382.79,-90.35
Top Assembly:
  lines w1: -348.82,-40.35 348.82,-40.35 348.82,40.35 -348.82,40.35 -348.82,-40.35
Top Value:
  text ".Comment" at -51.17,-7.5 h15
Top Component Center:
  lines w1: -10,0 10,0 ; 0,-10 0,10
Top Designator:
  text ".Designator" at -54.7,-5.36 h15
Top Component Outline:
  region: -332.79,-67.35 -332.79,-40.35 -348.82,-40.35 -348.82,40.35 -332.79,40.35 -332.79,67.35 332.79,67.35 332.79,40.35 348.82,40.35 348.82,-40.35 332.79,-40.35 332.79,-67.35
  region: -332.79,-67.35 -332.79,-40.35 -348.82,-40.35 -348.82,40.35 -332.79,40.35 -332.79,67.35 332.79,67.35 332.79,40.35 348.82,40.35 348.82,-40.35 332.79,-40.35 332.79,-67.35
3D body "DF40C-80DP.step": height 45.38, standoff 0.5, extent -344.87,-58.46 344.89,58.47

## CON100_0P4_21P7X2P05_SM [mil] "CON100_0P4_21P7X2P05_SM"
pads (104):
  rect 8x27 smd: 1(385.83,-53.85) 2(385.83,53.85) 3(370.08,-53.85) 4(370.08,53.85) 5(354.33,-53.85) 6(354.33,53.85) 7(338.58,-53.85) 8(338.58,53.85) 9(322.83,-53.85) 10(322.83,53.85) 11(307.09,-53.85) 12(307.09,53.85) 13(291.34,-53.85) 14(291.34,53.85) 15(275.59,-53.85) 16(275.59,53.85) 17(259.84,-53.85) 18(259.84,53.85) 19(244.09,-53.85) 20(244.09,53.85) 21(228.35,-53.85) 22(228.35,53.85) 23(212.6,-53.85) 24(212.6,53.85) 25(196.85,-53.85) 26(196.85,53.85) 27(181.1,-53.85) 28(181.1,53.85) 29(165.35,-53.85) 30(165.35,53.85) 31(149.61,-53.85) 32(149.61,53.85) 33(133.86,-53.85) 34(133.86,53.85) 35(118.11,-53.85) 36(118.11,53.85) 37(102.36,-53.85) 38(102.36,53.85) 39(86.61,-53.85) 40(86.61,53.85) 41(70.87,-53.85) 42(70.87,53.85) 43(55.12,-53.85) 44(55.12,53.85) 45(39.37,-53.85) 46(39.37,53.85) 47(23.62,-53.85) 48(23.62,53.85) 49(7.87,-53.85) 50(7.87,53.85) 51(-7.87,-53.85) 52(-7.87,53.85) 53(-23.62,-53.85) 54(-23.62,53.85) 55(-39.37,-53.85) 56(-39.37,53.85) 57(-55.12,-53.85) 58(-55.12,53.85) 59(-70.87,-53.85) 60(-70.87,53.85) 61(-86.61,-53.85) 62(-86.61,53.85) 63(-102.36,-53.85) 64(-102.36,53.85) 65(-118.11,-53.85) 66(-118.11,53.85) 67(-133.86,-53.85) 68(-133.86,53.85) 69(-149.61,-53.85) 70(-149.61,53.85) 71(-165.35,-53.85) 72(-165.35,53.85) 73(-181.1,-53.85) 74(-181.1,53.85) 75(-196.85,-53.85) 76(-196.85,53.85) 77(-212.6,-53.85) 78(-212.6,53.85) 79(-228.35,-53.85) 80(-228.35,53.85) 81(-244.09,-53.85) 82(-244.09,53.85) 83(-259.84,-53.85) 84(-259.84,53.85) 85(-275.59,-53.85) 86(-275.59,53.85) 87(-291.34,-53.85) 88(-291.34,53.85) 89(-307.09,-53.85) 90(-307.09,53.85) 91(-322.83,-53.85) 92(-322.83,53.85) 93(-338.58,-53.85) 94(-338.58,53.85) 95(-354.33,-53.85) 96(-354.33,53.85) 97(-370.08,-53.85) 98(-370.08,53.85) 99(-385.83,-53.85) 100(-385.83,53.85)
  rect 14x27 smd: ""(-404.53,-53.85) ""(-404.53,53.85) ""(404.53,-53.85) ""(404.53,53.85)
Top Overlay:
  lines w6: -423.23,-47.35 -434.56,-47.35 -434.56,47.35 -423.23,47.35 ; 423.23,-47.35 434.56,-47.35 434.56,47.35 423.23,47.35
  text "1" at 380,-80 h15
  text "2" at 380,95 h15
  text "99" at -399.32,-86.6 h15
  text "100" at -395,115 h15
Top Courtyard:
  region: 461.53,-117.35 -461.53,-117.35 -461.53,-90.35 -477.56,-90.35 -477.56,90.35 -461.53,90.35 -461.53,117.35 461.53,117.35 461.53,90.35 477.56,90.35 477.56,-90.35 461.53,-90.35
Top Assembly:
  lines w1: -427.56,-40.35 427.56,-40.35 427.56,40.35 -427.56,40.35 -427.56,-40.35
Top Value:
  text ".Comment" at -51.17,-7.5 h15
Top Component Center:
  lines w1: -10,0 10,0 ; 0,-10 0,10
Top Designator:
  text ".Designator" at -54.7,-5.36 h15
Top Component Outline:
  region: -411.53,-67.35 -411.53,-40.35 -427.56,-40.35 -427.56,40.35 -411.53,40.35 -411.53,67.35 411.53,67.35 411.53,40.35 427.56,40.35 427.56,-40.35 411.53,-40.35 411.53,-67.35
  region: -411.53,-67.35 -411.53,-40.35 -427.56,-40.35 -427.56,40.35 -411.53,40.35 -411.53,67.35 411.53,67.35 411.53,40.35 427.56,40.35 427.56,-40.35 411.53,-40.35 411.53,-67.35
3D body "DF40C-100DP.stp": height 45.38, standoff 0.5, extent -423.61,-58.46 423.63,58.47

## DFN2020_0P5_SQ2 [mil] "DFN2020_0P5_SQ2"
pads (9):
  rect 19x11 smd: 1(-35.83,29.53) 2(-35.83,9.84) 3(-35.83,-9.84) 4(-35.83,-29.53) 5(35.83,-29.53) 6(35.83,-9.84)
  rect 19x11 smd paste-99999: 7(35.83,9.84)
  oct 1x1 smd: 7(35.83,29.53)
  rect 36x63 smd paste-99999: 8(0,0)
Top Layer:
  region: 26.38,36.42 45.28,36.42 45.28,22.64 36.62,22.64 36.62,16.73 45.28,16.73 45.28,2.96 26.38,2.96
  region: 26.38,36.42 45.28,36.42 45.28,22.64 36.62,22.64 36.62,16.73 45.28,16.73 45.28,2.96 26.38,2.96
Top Overlay:
  circle w6: c-68.9,44.29 r9.84
  lines w6: -47.35,-45.01 -47.35,-47.35 47.35,-47.35 47.35,-45.01 ; -47.35,45.01 -47.35,47.35 47.35,47.35 47.35,46.37
Top Paste:
  region: -15.75,-29.53 -15.75,-7.87 15.75,-7.87 15.75,-29.53
  region: -15.75,29.53 -15.75,7.87 15.75,7.87 15.75,29.53
  region: 27.36,3.94 44.29,3.94 44.29,15.75 27.36,15.75
  region: 27.36,23.62 44.29,23.62 44.29,35.43 27.36,35.43
Top Solder:
  region: 24.41,38.39 47.25,38.39 47.25,20.67 38.59,20.67 38.59,18.7 47.25,18.7 47.25,0.99 24.41,0.99
  region: 24.41,38.39 47.25,38.39 47.25,20.67 38.59,20.67 38.59,18.7 47.25,18.7 47.25,0.99 24.41,0.99
Top Courtyard:
  region: -50.42,45.84 -50.42,51.16 50.28,51.16 50.28,47.23 55.26,47.23 55.26,-44.22 50.28,-44.22 50.28,-49.54 -50.42,-49.54 -50.42,-44.22 -55.4,-44.22 -55.4,45.84
Top Assembly:
  lines w1: -40.35,-40.35 -40.35,40.35 40.35,40.35 40.35,-40.35 -40.35,-40.35
Top Value:
  text ".Comment" at -51.17,-7.5 h15
Top Component Center:
  lines w1: -10,0 10,0 ; 0,-10 0,10
Top Designator:
  text ".Designator" at -54.7,-5.36 h15
Top Component Outline:
  region: -40.35,40.35 40.35,40.35 40.35,36.42 45.33,36.42 45.33,-35.03 40.35,-35.03 40.35,-40.35 -40.35,-40.35 -40.35,-35.03 -45.33,-35.03 -45.33,35.03 -40.35,35.03
  region: -40.35,40.35 40.35,40.35 40.35,36.42 45.33,36.42 45.33,-35.03 40.35,-35.03 40.35,-40.35 -40.35,-40.35 -40.35,-35.03 -45.33,-35.03 -45.33,35.03 -40.35,35.03
3D body "V-DFN2020-8-Type-F.step": height 32, standoff 0.5, extent -39.37,-39.37 39.37,39.37

## FBGA153_0P5_11P5X13 [mil] "FBGA153_0P5_11P5X13"
pads (153):
  round 10 smd: A1(-127.95,127.95) A2(-108.27,127.95) A3(-88.58,127.95) A4(-68.9,127.95) A5(-49.21,127.95) A6(-29.53,127.95) A7(-9.84,127.95) A8(9.84,127.95) A9(29.53,127.95) A10(49.21,127.95) A11(68.9,127.95) A12(88.58,127.95) A13(108.27,127.95) A14(127.95,127.95) B1(-127.95,108.27) B2(-108.27,108.27) B3(-88.58,108.27) B4(-68.9,108.27) B5(-49.21,108.27) B6(-29.53,108.27) B7(-9.84,108.27) B8(9.84,108.27) B9(29.53,108.27) B10(49.21,108.27) B11(68.9,108.27) B12(88.58,108.27) B13(108.27,108.27) B14(127.95,108.27) C1(-127.95,88.58) C2(-108.27,88.58) C3(-88.58,88.58) C4(-68.9,88.58) C5(-49.21,88.58) C6(-29.53,88.58) C7(-9.84,88.58) C8(9.84,88.58) C9(29.53,88.58) C10(49.21,88.58) C11(68.9,88.58) C12(88.58,88.58) C13(108.27,88.58) C14(127.95,88.58) D1(-127.95,68.9) D2(-108.27,68.9) D3(-88.58,68.9) D4(-68.9,68.9) D12(88.58,68.9) D13(108.27,68.9) D14(127.95,68.9) E1(-127.95,49.21) E2(-108.27,49.21) E3(-88.58,49.21) E5(-49.21,49.21) E6(-29.53,49.21) E7(-9.84,49.21) E8(9.84,49.21) E9(29.53,49.21) E10(49.21,49.21) E12(88.58,49.21) E13(108.27,49.21) E14(127.95,49.21) F1(-127.95,29.53) F2(-108.27,29.53) F3(-88.58,29.53) F5(-49.21,29.53) F10(49.21,29.53) F12(88.58,29.53) F13(108.27,29.53) F14(127.95,29.53) G1(-127.95,9.84) G2(-108.27,9.84) G3(-88.58,9.84) G5(-49.21,9.84) G10(49.21,9.84) G12(88.58,9.84) G13(108.27,9.84) G14(127.95,9.84) H1(-127.95,-9.84) H2(-108.27,-9.84) H3(-88.58,-9.84) H5(-49.21,-9.84) H10(49.21,-9.84) H12(88.58,-9.84) H13(108.27,-9.84) H14(127.95,-9.84) J1(-127.95,-29.53) J2(-108.27,-29.53) J3(-88.58,-29.53) J5(-49.21,-29.53) J10(49.21,-29.53) J12(88.58,-29.53) J13(108.27,-29.53) J14(127.95,-29.53) K1(-127.95,-49.21) K2(-108.27,-49.21) K3(-88.58,-49.21) K5(-49.21,-49.21) K6(-29.53,-49.21) K7(-9.84,-49.21) K8(9.84,-49.21) K9(29.53,-49.21) K10(49.21,-49.21) K12(88.58,-49.21) K13(108.27,-49.21) K14(127.95,-49.21) L1(-127.95,-68.9) L2(-108.27,-68.9) L3(-88.58,-68.9) L12(88.58,-68.9) L13(108.27,-68.9) L14(127.95,-68.9) M1(-127.95,-88.58) M2(-108.27,-88.58) M3(-88.58,-88.58) M4(-68.9,-88.58) M5(-49.21,-88.58) M6(-29.53,-88.58) M7(-9.84,-88.58) M8(9.84,-88.58) M9(29.53,-88.58) M10(49.21,-88.58) M11(68.9,-88.58) M12(88.58,-88.58) M13(108.27,-88.58) M14(127.95,-88.58) N1(-127.95,-108.27) N2(-108.27,-108.27) N3(-88.58,-108.27) N4(-68.9,-108.27) N5(-49.21,-108.27) N6(-29.53,-108.27) N7(-9.84,-108.27) N8(9.84,-108.27) N9(29.53,-108.27) N10(49.21,-108.27) N11(68.9,-108.27) N12(88.58,-108.27) N13(108.27,-108.27) N14(127.95,-108.27) P1(-127.95,-127.95) P2(-108.27,-127.95) P3(-88.58,-127.95) P4(-68.9,-127.95) P5(-49.21,-127.95) P6(-29.53,-127.95) P7(-9.84,-127.95) P8(9.84,-127.95) P9(29.53,-127.95) P10(49.21,-127.95) P11(68.9,-127.95) P12(88.58,-127.95) P13(108.27,-127.95) P14(127.95,-127.95)
Top Overlay:
  lines w6: -265.75,-49.21 -250,-49.21 ; -265.75,49.21 -250,49.21 ; -47.24,279.53 -47.24,295.28 ; 47.24,279.53 47.24,295.28 ; -235.35,-264.87 -235.35,235.77 -206.24,264.87 235.35,264.87 235.35,-264.87 -235.35,-264.87
  text "A" at -245.44,199.98 h15
  text "P" at -244.22,-238.05 h15
  text "14" at 145.6,274.06 h15
  text "1" at -121.41,281.27 h15
Top Courtyard:
  region: -240,270 240,270 240,-270 -240,-270
Top Assembly:
  lines w1: -265.75,-49.21 -250,-49.21 ; -265.75,49.21 -250,49.21 ; -47.24,279.53 -47.24,295.28 ; 47.24,279.53 47.24,295.28 ; -228.35,-257.87 -228.35,232.87 -203.35,257.87 228.35,257.87 228.35,-257.87 -228.35,-257.87
Top Value:
  text ".Comment" at -51.17,-7.5 h15
Top Component Center:
  lines w1: -10,0 10,0 ; 0,-10 0,10
Top Designator:
  text ".Designator" at -54.7,-5.36 h15
Top Component Outline:
  region: -228.35,-257.87 228.35,-257.87 228.35,257.87 -228.35,257.87
  region: -228.35,-257.87 228.35,-257.87 228.35,257.87 -228.35,257.87
3D body "153BallWFBGA_eMMC.step": height 35.77, standoff 0.21, extent -226.38,-255.91 226.38,255.91

## HVQFN56_0P4_7X7_EP4P7MM [mil] "HVQFN56_0P4_7X7_EP4P7MM"
pads (57):
  rect 35x8 smd: 1(-135.83,102.36) 2(-135.83,86.61) 3(-135.83,70.87) 4(-135.83,55.12) 5(-135.83,39.37) 6(-135.83,23.62) 7(-135.83,7.87) 8(-135.83,-7.87) 9(-135.83,-23.62) 10(-135.83,-39.37) 11(-135.83,-55.12) 12(-135.83,-70.87) 13(-135.83,-86.61) 14(-135.83,-102.36) 29(135.83,-102.36) 30(135.83,-86.61) 31(135.83,-70.87) 32(135.83,-55.12) 33(135.83,-39.37) 34(135.83,-23.62) 35(135.83,-7.87) 36(135.83,7.87) 37(135.83,23.62) 38(135.83,39.37) 39(135.83,55.12) 40(135.83,70.87) 41(135.83,86.61) 42(135.83,102.36)
  rect 8x35 smd: 15(-102.36,-135.83) 16(-86.61,-135.83) 17(-70.87,-135.83) 18(-55.12,-135.83) 19(-39.37,-135.83) 20(-23.62,-135.83) 21(-7.87,-135.83) 22(7.87,-135.83) 23(23.62,-135.83) 24(39.37,-135.83) 25(55.12,-135.83) 26(70.87,-135.83) 27(86.61,-135.83) 28(102.36,-135.83) 43(102.36,135.83) 44(86.61,135.83) 45(70.87,135.83) 46(55.12,135.83) 47(39.37,135.83) 48(23.62,135.83) 49(7.87,135.83) 50(-7.87,135.83) 51(-23.62,135.83) 52(-39.37,135.83) 53(-55.12,135.83) 54(-70.87,135.83) 55(-86.61,135.83) 56(-102.36,135.83)
  rect 185x185 smd paste-99999: 57(0,0)
Top Overlay:
  lines w6: -144.8,-116.67 -144.8,-144.8 -114.9,-144.8 ; -144.8,118.32 -144.8,129.05 -129.05,144.8 -118.78,144.8 ; 116.38,-144.8 144.8,-144.8 144.8,-117.56 ; 116.39,144.8 144.8,144.8 144.8,114.48
  text "15" at -175.12,-175.22 h15
  text "56" at -108.94,159.93 h15
  text "43" at 105.96,153.53 h15
  text "29" at 156.48,-141.07 h15
  text "1" at -173.7,94.47 h15
Top Paste:
  region: -78.94,-78.94 -5.71,-78.94 -5.71,-5.71 -78.94,-5.71
  region: 5.71,-78.94 78.94,-78.94 78.94,-5.71 5.71,-5.71
  region: 5.71,5.71 78.94,5.71 78.94,78.94 5.71,78.94
  region: -78.94,5.71 -5.71,5.71 -5.71,78.94 -78.94,78.94
Top Courtyard:
  region: 116.36,-163.33 -116.36,-163.33 -116.36,-147.8 -147.8,-147.8 -147.8,-116.36 -163.33,-116.36 -163.33,116.36 -147.8,116.36 -147.8,147.8 -116.36,147.8 -116.36,163.33 116.36,163.33 116.36,147.8 147.8,147.8 147.8,116.36 163.33,116.36 163.33,-116.36 147.8,-116.36 147.8,-147.8 116.36,-147.8
Top Assembly:
  lines w1: -137.8,-137.8 -137.8,122.05 -122.05,137.8 137.8,137.8 137.8,-137.8 -137.8,-137.8
Top Value:
  text ".Comment" at -51.17,-7.5 h15
Top Component Center:
  lines w1: -10,0 10,0 ; 0,-10 0,10
Top Designator:
  text ".Designator" at -54.7,-5.36 h15
Top Component Outline:
  region: -106.36,-153.33 -106.36,-137.8 -137.8,-137.8 -137.8,-106.36 -153.33,-106.36 -153.33,106.36 -137.8,106.36 -137.8,137.8 -106.36,137.8 -106.36,153.33 106.36,153.33 106.36,137.8 137.8,137.8 137.8,106.36 153.33,106.36 153.33,-106.36 137.8,-106.36 137.8,-137.8 106.36,-137.8 106.36,-153.33
  region: -106.36,-153.33 -106.36,-137.8 -137.8,-137.8 -137.8,-106.36 -153.33,-106.36 -153.33,106.36 -137.8,106.36 -137.8,137.8 -106.36,137.8 -106.36,153.33 106.36,153.33 106.36,137.8 137.8,137.8 137.8,106.36 153.33,106.36 153.33,-106.36 137.8,-106.36 137.8,-137.8 106.36,-137.8 106.36,-153.33
3D body "HQFN 56.step": height 33.47, standoff -0.79, extent -137.83,-137.83 137.83,137.83

## HWSON8_0P5_3P1X2P1 [mil] "HWSON8_0P5_3P1X2P1"
pads (9):
  rect 25x10 smd: 1(-55.61,29.53) 2(-55.61,9.84) 3(-55.61,-9.84) 4(-55.61,-29.53) 5(55.61,-29.53) 6(55.61,-9.84) 7(55.61,9.84) 8(55.61,29.53)
  rect 63x63 smd paste-99999: 9(0,0)
Top Overlay:
  lines w6: -68.02,-48.34 68.02,-48.34 ; -68.02,48.34 -12.69,48.34 ccw(c0,53.82) 12.69,48.34 68.02,48.34
  text "1" at -79.68,71.03 h15
  text "4" at -85.37,-56.34 h15
  text "5" at 86.49,-20.05 h15
  text "8" at 79.37,69.26 h15
Top Paste:
  region: -23.62,-23.62 -23.62,23.62 23.62,23.62 23.62,-23.62
Top Courtyard:
  region: 71.02,-51.34 -71.02,-51.34 -71.02,-44.53 -78.11,-44.53 -78.11,44.53 -71.02,44.53 -71.02,51.34 71.02,51.34 71.02,44.53 78.11,44.53 78.11,-44.53 71.02,-44.53
Top Assembly:
  lines w1: -19.69,41.34 -61.02,41.34 -61.02,-41.34 61.02,-41.34 61.02,41.34 19.69,41.34
Top Value:
  text ".Comment" at -51.17,-7.5 h15
Top Component Center:
  lines w1: -10,0 10,0 ; 0,-10 0,10
Top Designator:
  text ".Designator" at -54.7,-5.36 h15
Top Component Outline:
  region: -61.02,-41.34 -61.02,-34.53 -68.11,-34.53 -68.11,34.53 -61.02,34.53 -61.02,41.34 61.02,41.34 61.02,34.53 68.11,34.53 68.11,-34.53 61.02,-34.53 61.02,-41.34
  region: -61.02,-41.34 -61.02,-34.53 -68.11,-34.53 -68.11,34.53 -61.02,34.53 -61.02,41.34 61.02,41.34 61.02,34.53 68.11,34.53 68.11,-34.53 61.02,-34.53 61.02,-41.34
3D body "HWSON8-2x3x0_80.step": height 32, standoff 0.5, extent -59.05,-39.37 59.06,39.37